# Altium footprint library lib_protel_HC_BOINA.PCBLIB: 726 footprints (part 43 of 46)
Each footprint in its own frame and in the unit in brackets; x right, y up, seen from the top. Pads: shape width x height; smd on the part's side, far side on the other; paste and mask are expansions set on the pad; w line width, h text height; cw(c..) or ccw(c..) is an arc to the next point about the centre after c.
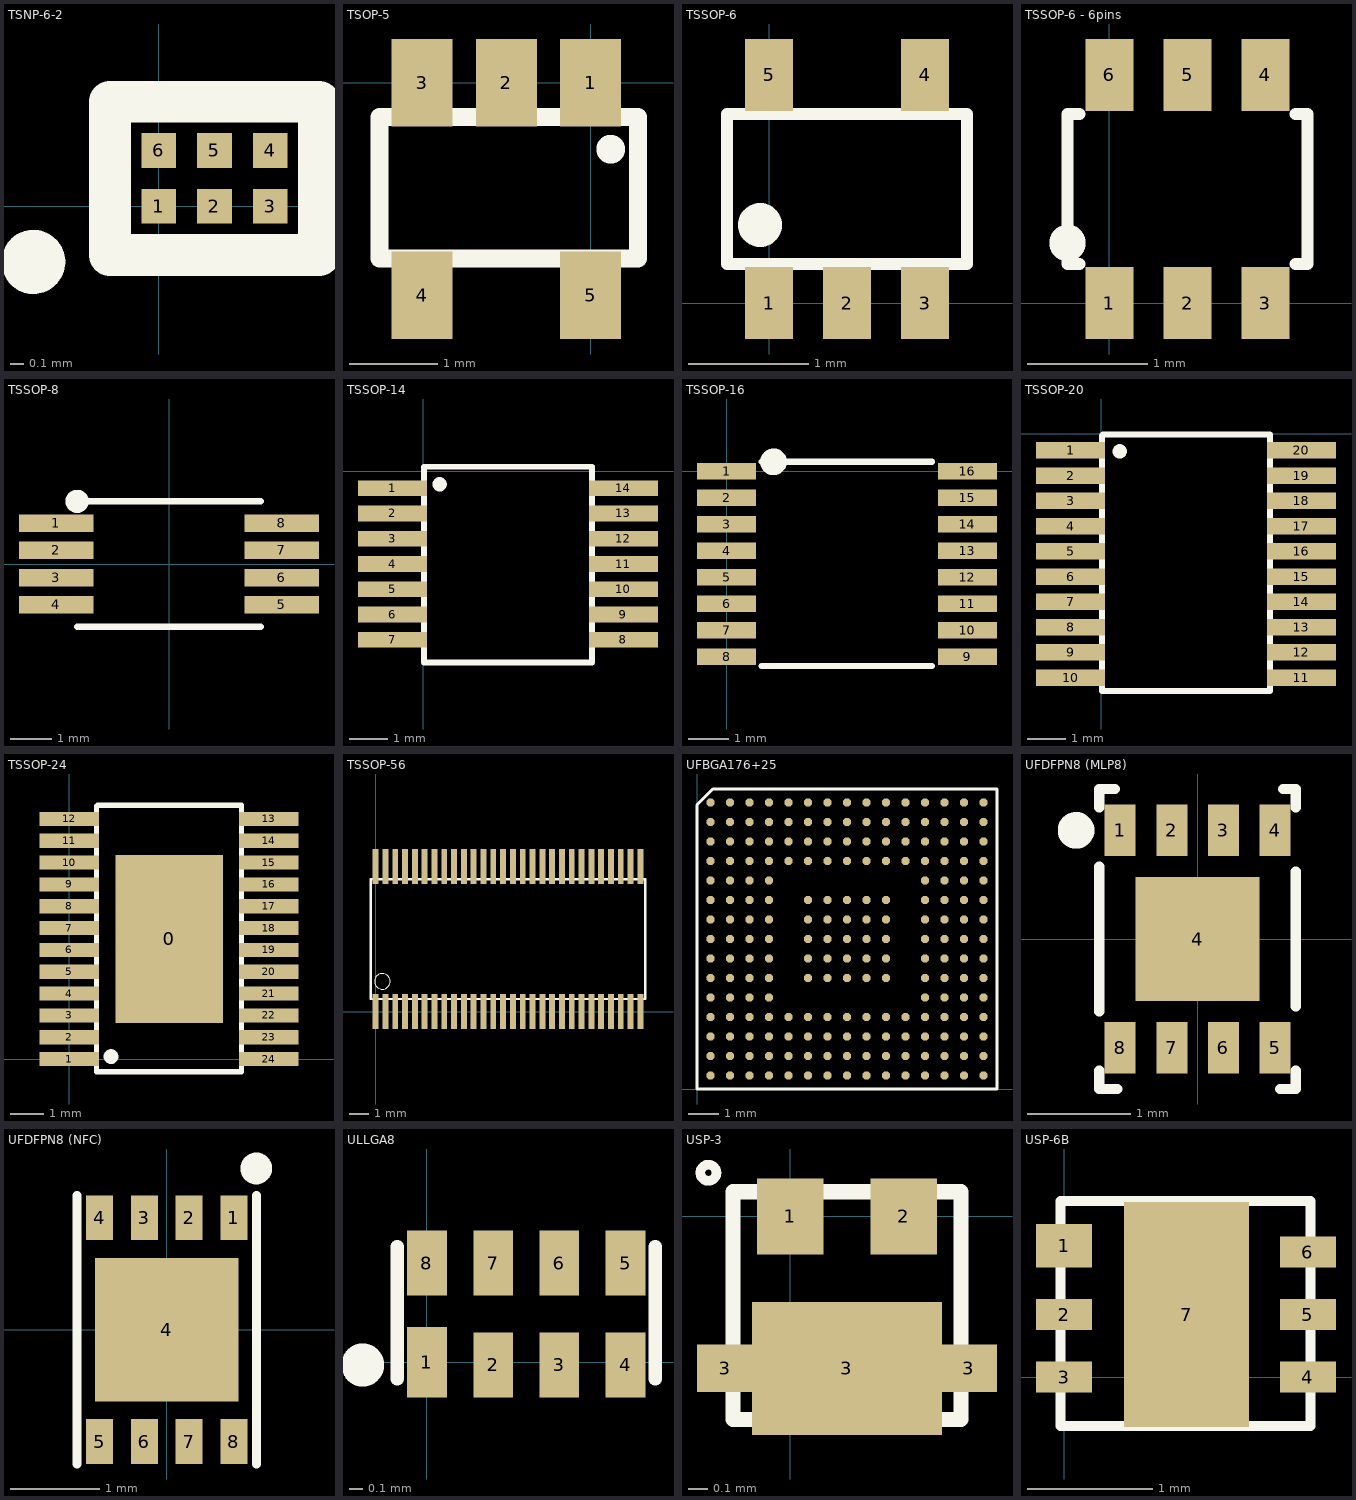
[diagram p42: the footprints below, top view; thin cyan lines are the x and y axes]

## TSNP-6-2 [mm] "TSNP-6-2, 6-XSON, 6XFDFN"
height 0.375
pads (6):
  rect 0.25x0.25 smd mask+0.07: 1(0,0) 2(0.4,0) 3(0.8,0) 4(0.8,0.4) 5(0.4,0.4) 6(0,0.4)
Top Overlay:
  circle w0.254: c-0.9,-0.4 r0.103
  lines w0.3: 1.15,-0.35 -0.35,-0.35 -0.35,0.75 1.15,0.75 ; 1.15,-0.3 1.15,0.75 ; 1.15,0.75 1.15,0.75

## TSOP-5 [mm] "TSOP-5"
height 1.1
pads (5):
  rect 0.69x0.99 smd: 1(0,0) 2(-0.953,0) 3(-1.906,0) 4(-1.906,-2.4) 5(0,-2.4)
Top Overlay:
  circle w0.254: c0.225,-0.75 r0.035
  lines w0.203: -2.388,-1.988 0.532,-1.988 0.532,-0.388 -2.388,-0.388 -2.388,-1.988
3D body "SW3dPS-SOT-23-5L.STEP": height 1.09, standoff -0.02, extent -2.375,-2.6 0.525,0.2

## TSSOP-6 [mm] "TSSOP-6"
height 1
pads (5):
  rect 0.4x0.6 smd: 1(0,0) 2(0.65,0) 3(1.3,0) 4(1.3,1.9) 5(0,1.9)
Top Overlay:
  circle w0.254: c-0.075,0.65 r0.056
  lines w0.1: -0.35,0.325 -0.35,1.575 1.65,1.575 1.65,0.325 -0.35,0.325

## TSSOP-6 - 6pins [mm] "TSSOP-6"
pads (6):
  rect 0.4x0.6 smd: 1(0,0) 2(0.65,0) 3(1.3,0) 4(1.3,1.9) 5(0.65,1.9) 6(0,1.9)
Top Overlay:
  circle w0.254: c-0.35,0.5 r0.025
  lines w0.1: -0.25,0.325 -0.35,0.325 -0.35,1.575 -0.25,1.575 ; 1.55,0.325 1.65,0.325 1.65,1.575 1.55,1.575

## TSSOP-8 [mm] "TSSOP-8"
height 1.1
pads (8):
  rect 1.78x0.42 smd: 1(-2.7,0.975) 2(-2.7,0.325) 3(-2.7,-0.325) 4(-2.7,-0.975) 5(2.7,-0.975) 6(2.7,-0.325) 7(2.7,0.325) 8(2.7,0.975)
Top Overlay:
  circle w0.254: c-2.2,1.5 r0.15
  lines w0.152: -2.2,-1.5 2.2,-1.5 ; -2.2,1.5 2.2,1.5
3D body "User Library-TSSOPTSSOP65P640X120-8N.STEP": height 1.2, standoff 0, extent -3.25,-1.55 3.25,1.55

## TSSOP-14 [mm] "TSSOP-14"
height 1.2
pads (14):
  rect 1.78x0.4 smd mask+0: 1(-0.787,-0.432) 2(-0.787,-1.082) 3(-0.787,-1.732) 4(-0.787,-2.382) 5(-0.787,-3.032) 6(-0.787,-3.682) 7(-0.787,-4.332) 8(5.153,-4.332) 9(5.153,-3.682) 10(5.153,-3.032) 11(5.153,-2.382) 12(5.153,-1.732) 13(5.153,-1.082) 14(5.153,-0.432)
Top Overlay:
  circle w0.254: c0.423,-0.33 r0.057
  lines w0.152: 0.025,-4.92 4.343,-4.92 4.343,0.12 0.03,0.12 0.025,0.115 0.025,-4.92

## TSSOP-16 [mm] "TSSOP-16"
height 1.1
pads (16):
  rect 1.45x0.4 smd: 1(0,0) 2(0,-0.65) 3(0,-1.3) 4(0,-1.95) 5(0,-2.6) 6(0,-3.25) 7(0,-3.9) 8(0,-4.55) 9(5.9,-4.55) 10(5.9,-3.9) 11(5.9,-3.25) 12(5.9,-2.6) 13(5.9,-1.95) 14(5.9,-1.3) 15(5.9,-0.65) 16(5.9,0)
Top Overlay:
  circle w0.254: c1.15,0.229 r0.2
  lines w0.152: 0.864,-4.775 5.029,-4.775 ; 0.864,0.229 5.029,0.229
3D body "User Library-TSSOP-16-1.step": height 1.1, standoff 0, extent -0.25,-4.775 6.15,0.225

## TSSOP-20 [mm] "TSSOP-20 para SN74AC573PW"
height 1.2
pads (20):
  rect 1.78x0.42 smd mask+0: 1(-0.787,-0.432) 2(-0.787,-1.082) 3(-0.787,-1.732) 4(-0.787,-2.382) 5(-0.787,-3.032) 6(-0.787,-3.682) 7(-0.787,-4.332) 8(-0.787,-4.982) 9(-0.787,-5.632) 10(-0.787,-6.282) 11(5.153,-6.282) 12(5.153,-5.632) 13(5.153,-4.982) 14(5.153,-4.332) 15(5.153,-3.682) 16(5.153,-3.032) 17(5.153,-2.382) 18(5.153,-1.732) 19(5.153,-1.082) 20(5.153,-0.432)
Top Overlay:
  circle w0.254: c0.477,-0.457 r0.057
  lines w0.152: 0.025,-0.076 0.025,-6.629 4.343,-6.629 4.343,-0.025 0.051,-0.025 0.025,-0.051

## TSSOP-24 [mm] "TSSOP-24 para TDA7493"
height 1.2
pads (25):
  rect 3.2x5 smd: 0(2.975,3.575)
  rect 1.78x0.42 smd mask+0: 1(0,0) 2(0,0.65) 3(0,1.3) 4(0,1.95) 5(0,2.6) 6(0,3.25) 7(0,3.9) 8(0,4.55) 9(0,5.2) 10(0,5.85) 11(0,6.5) 12(0,7.15) 13(5.94,7.15) 14(5.94,6.5) 15(5.94,5.85) 16(5.94,5.2) 17(5.94,4.55) 18(5.94,3.9) 19(5.94,3.25) 20(5.94,2.6) 21(5.94,1.95) 22(5.94,1.3) 23(5.94,0.65) 24(5.94,0)
Top Overlay:
  circle w0.254: c1.243,0.075 r0.093
  lines w0.152: 0.813,7.506 0.813,-0.375 5.131,-0.375 5.131,7.556 0.838,7.556 0.813,7.531

## TSSOP-56 [mm] "TSSOP-56 PARA LVDS"
height 0.9
pads (56):
  rect 0.3x1.8 smd: 1(0,0) 2(0.5,0) 3(1,0) 4(1.5,0) 5(2,0) 6(2.5,0) 7(3,0) 8(3.5,0) 9(4,0) 10(4.5,0) 11(5,0) 12(5.5,0) 13(6,0) 14(6.5,0) 15(7,0) 16(7.5,0) 17(8,0) 18(8.5,0) 19(9,0) 20(9.5,0) 21(10,0) 22(10.5,0) 23(11,0) 24(11.5,0) 25(12,0) 26(12.5,0) 27(13,0) 28(13.5,0) 29(13.5,7.4) 30(13,7.4) 31(12.5,7.4) 32(12,7.4) 33(11.5,7.4) 34(11,7.4) 35(10.5,7.4) 36(10,7.4) 37(9.5,7.4) 38(9,7.4) 39(8.5,7.4) 40(8,7.4) 41(7.5,7.4) 42(7,7.4) 43(6.5,7.4) 44(6,7.4) 45(5.5,7.4) 46(5,7.4) 47(4.5,7.4) 48(4,7.4) 49(3.5,7.4) 50(3,7.4) 51(2.5,7.4) 52(2,7.4) 53(1.5,7.4) 54(1,7.4) 55(0.5,7.4) 56(0,7.4)
Top Overlay:
  circle w0.051: c0.34,1.54 r0.399
  lines w0.127: -0.26,0.64 -0.26,6.74 13.74,6.74 13.74,0.64 -0.26,0.64

## UFBGA176+25 [mm] "STM32F437II"
height 0.6
pads (201):
  round 0.28 smd mask+0.05: A1(0.45,9.55) A2(1.1,9.55) A3(1.75,9.55) A4(2.4,9.55) A5(3.05,9.55) A6(3.7,9.55) A7(4.35,9.55) A8(5,9.55) A9(5.65,9.55) A10(6.3,9.55) A11(6.95,9.55) A12(7.6,9.55) A13(8.25,9.55) A14(8.9,9.55) A15(9.55,9.55) B1(0.45,8.9) B2(1.1,8.9) B3(1.75,8.9) B4(2.4,8.9) B5(3.05,8.9) B6(3.7,8.9) B7(4.35,8.9) B8(5,8.9) B9(5.65,8.9) B10(6.3,8.9) B11(6.95,8.9) B12(7.6,8.9) B13(8.25,8.9) B14(8.9,8.9) B15(9.55,8.9) C1(0.45,8.25) C2(1.1,8.25) C3(1.75,8.25) C4(2.4,8.25) C5(3.05,8.25) C6(3.7,8.25) C7(4.35,8.25) C8(5,8.25) C9(5.65,8.25) C10(6.3,8.25) C11(6.95,8.25) C12(7.6,8.25) C13(8.25,8.25) C14(8.9,8.25) C15(9.55,8.25) D1(0.45,7.6) D2(1.1,7.6) D3(1.75,7.6) D4(2.4,7.6) D5(3.05,7.6) D6(3.7,7.6) D7(4.35,7.6) D8(5,7.6) D9(5.65,7.6) D10(6.3,7.6) D11(6.95,7.6) D12(7.6,7.6) D13(8.25,7.6) D14(8.9,7.6) D15(9.55,7.6) E1(0.45,6.95) E2(1.1,6.95) E3(1.75,6.95) E4(2.4,6.95) E12(7.6,6.95) E13(8.25,6.95) E14(8.9,6.95) E15(9.55,6.95) F1(0.45,6.3) F2(1.1,6.3) F3(1.75,6.3) F4(2.4,6.3) F6(3.7,6.3) F7(4.35,6.3) F8(5,6.3) F9(5.65,6.3) F10(6.3,6.3) F12(7.6,6.3) F13(8.25,6.3) F14(8.9,6.3) F15(9.55,6.3) G1(0.45,5.65) G2(1.1,5.65) G3(1.75,5.65) G4(2.4,5.65) G6(3.7,5.65) G7(4.35,5.65) G8(5,5.65) G9(5.65,5.65) G10(6.3,5.65) G12(7.6,5.65) G13(8.25,5.65) G14(8.9,5.65) G15(9.55,5.65) H1(0.45,5) H2(1.1,5) H3(1.75,5) H4(2.4,5) H6(3.7,5) H7(4.35,5) H8(5,5) H9(5.65,5) H10(6.3,5) H12(7.6,5) H13(8.25,5) H14(8.9,5) H15(9.55,5) J1(0.45,4.35) J2(1.1,4.35) J3(1.75,4.35) J4(2.4,4.35) J6(3.7,4.35) J7(4.35,4.35) J8(5,4.35) J9(5.65,4.35) J10(6.3,4.35) J12(7.6,4.35) J13(8.25,4.35) J14(8.9,4.35) J15(9.55,4.35) K1(0.45,3.7) K2(1.1,3.7) K3(1.75,3.7) K4(2.4,3.7) K6(3.7,3.7) K7(4.35,3.7) K8(5,3.7) K9(5.65,3.7) K10(6.3,3.7) K12(7.6,3.7) K13(8.25,3.7) K14(8.9,3.7) K15(9.55,3.7) L1(0.45,3.05) L2(1.1,3.05) L3(1.75,3.05) L4(2.4,3.05) L12(7.6,3.05) L13(8.25,3.05) L14(8.9,3.05) L15(9.55,3.05) M1(0.45,2.4) M2(1.1,2.4) M3(1.75,2.4) M4(2.4,2.4) M5(3.05,2.4) M6(3.7,2.4) M7(4.35,2.4) M8(5,2.4) M9(5.65,2.4) M10(6.3,2.4) M11(6.95,2.4) M12(7.6,2.4) M13(8.25,2.4) M14(8.9,2.4) M15(9.55,2.4) N1(0.45,1.75) N2(1.1,1.75) N3(1.75,1.75) N4(2.4,1.75) N5(3.05,1.75) N6(3.7,1.75) N7(4.35,1.75) N8(5,1.75) N9(5.65,1.75) N10(6.3,1.75) N11(6.95,1.75) N12(7.6,1.75) N13(8.25,1.75) N14(8.9,1.75) N15(9.55,1.75) P1(0.45,1.1) P2(1.1,1.1) P3(1.75,1.1) P4(2.4,1.1) P5(3.05,1.1) P6(3.7,1.1) P7(4.35,1.1) P8(5,1.1) P9(5.65,1.1) P10(6.3,1.1) P11(6.95,1.1) P12(7.6,1.1) P13(8.25,1.1) P14(8.9,1.1) P15(9.55,1.1) R1(0.45,0.45) R2(1.1,0.45) R3(1.75,0.45) R4(2.4,0.45) R5(3.05,0.45) R6(3.7,0.45) R7(4.35,0.45) R8(5,0.45) R9(5.65,0.45) R10(6.3,0.45) R11(6.95,0.45) R12(7.6,0.45) R13(8.25,0.45) R14(8.9,0.45) R15(9.55,0.45)
Top Overlay:
  lines w0.1: 0,0 0,9.475 0.525,10 10,10 10,0 0,0

## UFDFPN8 (MLP8) [mm] "CHIP NFC M24LR64E-R"
height 0.5
pads (9):
  rect 0.3x0.5 smd mask+0.05: 1(-0.75,1.05) 2(-0.25,1.05) 3(0.25,1.05) 4(0.75,1.05) 6(0.25,-1.05) 7(-0.25,-1.05) 8(-0.75,-1.05)
  rect 1.2x1.2 smd mask+0.05: 4(0,0)
  rect 0.3x0.5 smd paste+0 mask+0.05: 5(0.75,-1.05)
Top Overlay:
  circle w0.254: c-1.175,1.05 r0.05
  lines w0.1: -0.95,-1.275 -0.95,-1.45 -0.775,-1.45 ; -0.95,-0.7 -0.95,0.7 ; -0.95,1.275 -0.95,1.45 -0.8,1.45 ; 0.8,-1.45 0.95,-1.45 0.95,-1.275 ; 0.825,1.45 0.95,1.45 0.95,1.275 ; 0.95,-0.65 0.95,0.65

## UFDFPN8 (NFC) [mm] "CHIP NFC M24LR64E-R"
height 0.5
pads (9):
  rect 0.3x0.5 smd mask+0.05: 1(0.75,1.25) 2(0.25,1.25) 3(-0.25,1.25) 4(-0.75,1.25) 5(-0.75,-1.25) 6(-0.25,-1.25) 7(0.25,-1.25)
  rect 1.6x1.6 smd mask+0.05: 4(0,0)
  rect 0.3x0.5 smd paste+0 mask+0.05: 8(0.75,-1.25)
Top Overlay:
  circle w0.254: c1,1.8 r0.05
  lines w0.1: -1,-1.5 -1,1.5 ; 1,-1.5 1,1.5
3D body "User Library-UFDFPN8.step": height 0.5, standoff -0.05, extent -0.96,-1.53 1.04,1.47

## ULLGA8 [mm] "1.95 X 1.0 0.5P"
height 0.4
pads (8):
  rect 0.3x0.53 smd: 1(0,0)
  rect 0.3x0.49 smd: 2(0.5,-0.02) 3(1,-0.02) 4(1.5,-0.02) 5(1.5,0.75) 6(1,0.75) 7(0.5,0.75) 8(0,0.75)
Top Overlay:
  circle w0.254: c-0.485,-0.02 r0.035
  lines w0.1: -0.225,-0.125 -0.225,0.875 ; 1.725,-0.125 1.725,0.875

## USP-3 [mm] "XC6218P122H"
height 0.6
pads (5):
  rect 0.35x0.4 smd: 1(0,0) 2(0.6,0)
  rect 0.3x0.25 smd paste+0 mask+0: 3(-0.34,-0.8) 3(0.94,-0.8)
  rect 1x0.7 smd: 3(0.3,-0.8)
Top Overlay:
  circle w0.051: c-0.43,0.23 r0.042
  lines w0.08: -0.3,-1.07 -0.3,0.13 0.9,0.13 0.9,-1.07 -0.3,-1.07

## USP-6B [mm] "XC6401EG67DR"
height 1.1
pads (7):
  rect 0.45x0.35 smd: 1(0,1.05)
  rect 0.45x0.25 smd: 2(0,0.5) 3(0,0) 4(1.95,0) 5(1.95,0.5) 6(1.95,1)
  rect 1x1.8 smd: 7(0.98,0.5)
Top Overlay:
  lines w0.08: -0.03,-0.39 -0.03,1.41 1.97,1.41 1.97,-0.39 -0.03,-0.39